# Altium footprint library gpa_connectors.PcbLib: 22 footprints (part 2 of 2)
Each footprint in its own frame and in the unit in brackets; x right, y up, seen from the top. Pads: shape width x height; smd on the part's side, far side on the other; paste and mask are expansions set on the pad; w line width, h text height; cw(c..) or ccw(c..) is an arc to the next point about the centre after c.
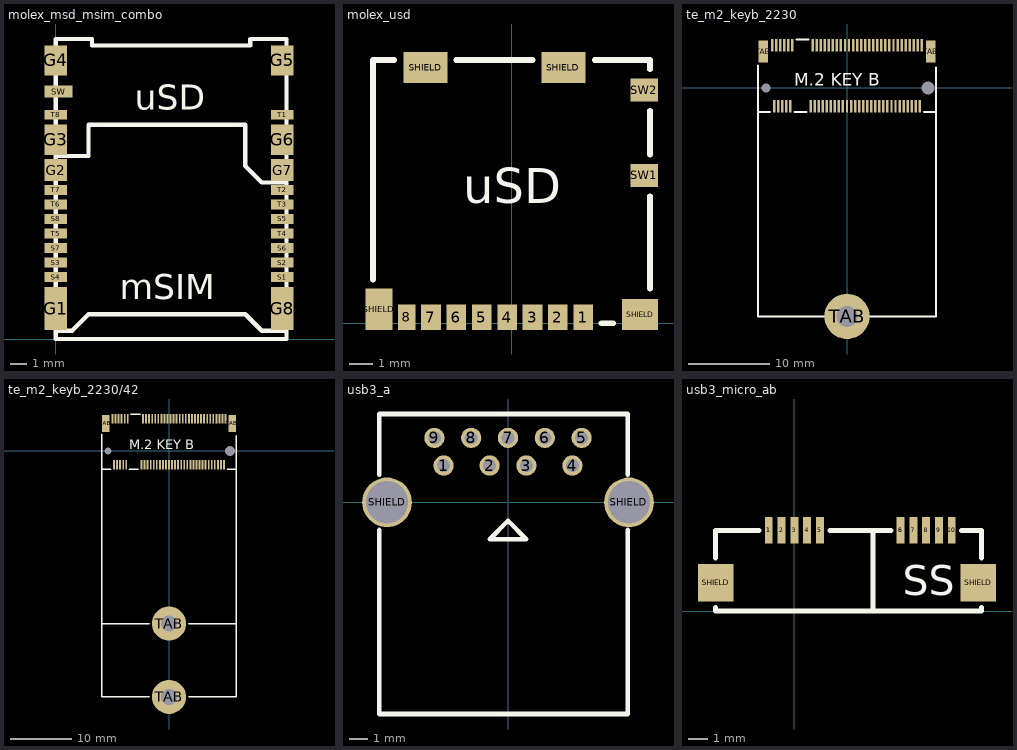
[diagram p1: the footprints below, top view; thin cyan lines are the x and y axes]

## molex_msd_msim_combo [mm]
pads (25):
  rect 1.35x2.6 smd: G1(0,1.85) G8(13.75,1.85)
  rect 1.35x1.34 smd: G2(0,10.25) G7(13.75,10.25)
  rect 1.35x1.84 smd: G3(0,12.09) G6(13.75,12.09)
  rect 1.35x1.8 smd: G4(0,16.9) G5(13.75,16.9)
  rect 1.35x0.58 smd: S1(13.75,3.76) S2(13.75,4.64) S3(0,4.64) S4(0,3.76) S5(13.75,7.28) S6(13.75,5.52) S7(0,5.52) S8(0,7.28) T1(13.75,13.6) T2(13.75,9.04) T3(13.75,8.16) T4(13.75,6.4) T5(0,6.4) T6(0,8.16) T7(0,9.04) T8(0,13.6)
  rect 1.7x0.7 smd: SW(0.175,15.015)
Top Overlay:
  lines w0.254: 0,0.5 1,0.5 2,1.5 11.5,1.5 12.5,0.5 14,0.5 ; 0,11.1 2,11.1 2,13 11.5,13 11.5,10.5 12.5,9.5 14,9.5 ; 0,0 0,18.2 2.2,18.2 2.2,17.8 11.8,17.8 11.8,18.2 14,18.2 14,0 0,0
  text "uSD" at 4.8,13.9 h1.52
  text "mSIM" at 3.9,2.4 h1.52
3D body "1046421610.stp": height 2.09, standoff -0.01, extent 0,0 14.1,18.25

## molex_usd [mm] "104031-0811"
pads (14):
  rect 0.85x1.1 smd: 1(3.105,0.25) 2(2.005,0.25) 3(0.905,0.25) 4(-0.195,0.25) 5(-1.295,0.25) 6(-2.395,0.25) 7(-3.495,0.25)
  rect 0.75x1.1 smd: 8(-4.545,0.25)
  rect 1.17x1.8 smd: SHIELD(-5.755,0.6)
  rect 1.9x1.35 smd: SHIELD(-3.73,11.075) SHIELD(2.24,11.075)
  rect 1.55x1.35 smd: SHIELD(5.565,0.375)
  rect 1.2x1 smd: SW1(5.74,6.4) SW2(5.74,10.1)
Top Overlay:
  lines w0.254: -6,1.9 -6,11.4 -5.1,11.4 ; -2.4,11.4 0.9,11.4 ; 3.6,11.4 6,11.4 6,11 ; 3.9,0 4.4,0 ; 6,1.5 6,5.5 ; 6,7.3 6,9.2
  text "uSD" at -2.1,5.2 h1.52
3D body "1040310811.stp": height 1.44, standoff -0.01, extent -5.975,0 5.975,11.4

## te_m2_keyb_2230 [mm] "TE Connectivity 2199230-5 + JAE SM3ZS067U410"
pads (72):
  rect 0.3x1.55 smd: 1(-9.25,5.275) 2(-9,-2.275) 3(-8.75,5.275) 4(-8.5,-2.275) 5(-8.25,5.275) 6(-8,-2.275) 7(-7.75,5.275) 8(-7.5,-2.275) 9(-7.25,5.275) 10(-7,-2.275) 11(-6.75,5.275) 20(-4.5,-2.275) 21(-4.25,5.275) 22(-4,-2.275) 23(-3.75,5.275) 24(-3.5,-2.275) 25(-3.25,5.275) 26(-3,-2.275) 27(-2.75,5.275) 28(-2.5,-2.275) 29(-2.25,5.275) 30(-2,-2.275) 31(-1.75,5.275) 32(-1.5,-2.275) 33(-1.25,5.275) 34(-1,-2.275) 35(-0.75,5.275) 36(-0.5,-2.275) 37(-0.25,5.275) 38(0,-2.275) 39(0.25,5.275) 40(0.5,-2.275) 41(0.75,5.275) 42(1,-2.275) 43(1.25,5.275) 44(1.5,-2.275) 45(1.75,5.275) 46(2,-2.275) 47(2.25,5.275) 48(2.5,-2.275) 49(2.75,5.275) 50(3,-2.275) 51(3.25,5.275) 52(3.5,-2.275) 53(3.75,5.275) 54(4,-2.275) 55(4.25,5.275) 56(4.5,-2.275) 57(4.75,5.275) 58(5,-2.275) 59(5.25,5.275) 60(5.5,-2.275) 61(5.75,5.275) 62(6,-2.275) 63(6.25,5.275) 64(6.5,-2.275) 65(6.75,5.275) 66(7,-2.275) 67(7.25,5.275) 68(7.5,-2.275) 69(7.75,5.275) 70(8,-2.275) 71(8.25,5.275) 72(8.5,-2.275) 73(8.75,5.275) 74(9,-2.275) 75(9.25,5.275)
  round 0.5 hole 1.1: ALIGN(-10,0)
  round 0.5 hole 1.6: ALIGN(10,0)
  rect 1.2x2.75 smd: TAB(-10.35,4.5) TAB(10.35,4.5)
  round 5.6 hole 2.6: TAB(0,-28.25)
Top Overlay:
  lines w0.254: -11,2.75 -11,-3 ; -9.5,-3 -11,-3 ; -6.5,-3 -5,-3 ; -6.25,6 -4.75,6 ; 9.5,-3 11,-3 ; 11,2.5 11,-3 ; -11,-3 -11,-28.25 1.75,-28.25 11,-28.25 11,-3
  text "M.2 KEY B" at -6.5,0.25 h1.52
3D body "c-2199230-5-b1-3d.stp": height 4.09, standoff -0.62, extent -10.95,-2.85 10.95,5.85

## te_m2_keyb_2230/42 [mm] "TE Connectivity 2199230-5 + JAE SM3ZS067U410"
pads (73):
  rect 0.3x1.55 smd: 1(-9.25,5.275) 2(-9,-2.275) 3(-8.75,5.275) 4(-8.5,-2.275) 5(-8.25,5.275) 6(-8,-2.275) 7(-7.75,5.275) 8(-7.5,-2.275) 9(-7.25,5.275) 10(-7,-2.275) 11(-6.75,5.275) 20(-4.5,-2.275) 21(-4.25,5.275) 22(-4,-2.275) 23(-3.75,5.275) 24(-3.5,-2.275) 25(-3.25,5.275) 26(-3,-2.275) 27(-2.75,5.275) 28(-2.5,-2.275) 29(-2.25,5.275) 30(-2,-2.275) 31(-1.75,5.275) 32(-1.5,-2.275) 33(-1.25,5.275) 34(-1,-2.275) 35(-0.75,5.275) 36(-0.5,-2.275) 37(-0.25,5.275) 38(0,-2.275) 39(0.25,5.275) 40(0.5,-2.275) 41(0.75,5.275) 42(1,-2.275) 43(1.25,5.275) 44(1.5,-2.275) 45(1.75,5.275) 46(2,-2.275) 47(2.25,5.275) 48(2.5,-2.275) 49(2.75,5.275) 50(3,-2.275) 51(3.25,5.275) 52(3.5,-2.275) 53(3.75,5.275) 54(4,-2.275) 55(4.25,5.275) 56(4.5,-2.275) 57(4.75,5.275) 58(5,-2.275) 59(5.25,5.275) 60(5.5,-2.275) 61(5.75,5.275) 62(6,-2.275) 63(6.25,5.275) 64(6.5,-2.275) 65(6.75,5.275) 66(7,-2.275) 67(7.25,5.275) 68(7.5,-2.275) 69(7.75,5.275) 70(8,-2.275) 71(8.25,5.275) 72(8.5,-2.275) 73(8.75,5.275) 74(9,-2.275) 75(9.25,5.275)
  round 0.5 hole 1.1: ALIGN(-10,0)
  round 0.5 hole 1.6: ALIGN(10,0)
  rect 1.2x2.75 smd: TAB(-10.35,4.5) TAB(10.35,4.5)
  round 5.6 hole 2.6: TAB(0,-40.25) TAB(0,-28.25)
Top Overlay:
  lines w0.254: -11,-28.25 -3.25,-28.25 ; -11,2.75 -11,-3 ; -9.5,-3 -11,-3 ; -6.5,-3 -5,-3 ; -6.25,6 -4.75,6 ; -3.25,-40.25 -11,-40.25 -11,-3 ; 3.25,-40.25 11,-40.25 11,-3 ; 3.25,-28.25 11,-28.25 ; 9.5,-3 11,-3 ; 11,2.5 11,-3
  text "M.2 KEY B" at -6.5,0.25 h1.52
3D body "c-2199230-5-b1-3d.stp": height 4.09, standoff -0.62, extent -10.95,-2.85 10.95,5.85

## usb3_a [mm] "Molex 48405-000X"
pads (11):
  round 1.1 hole 0.7: 1(-3.5,2) 2(-1,2) 3(1,2) 4(3.5,2) 5(4,3.5) 6(2,3.5) 7(0,3.5) 8(-2,3.5) 9(-4,3.5)
  round 2.7 hole 2.3: SHIELD(-6.57,0) SHIELD(6.57,0)
Top Overlay:
  lines w0.254: -7,-1.5 -7,-11.5 6.5,-11.5 6.5,-1.5 ; -7,1.5 -7,4.8 6.5,4.8 6.5,1.5 ; -1,-2 1,-2 0,-1 -1,-2
3D body "484050003.stp": height 7.56, standoff -4.04, extent -7.73,-11.75 7.73,4.75

## usb3_micro_ab [mm]
pads (14):
  rect 0.4x1.35 smd: 1(-1.3,4.125) 1(-1.3,4.125) 2(-0.65,4.125) 3(0,4.125) 4(0.65,4.125) 5(1.3,4.125) 6(5.4,4.125) 6(5.4,4.125) 7(6.05,4.125) 8(6.7,4.125) 9(7.35,4.125) 10(8,4.125)
  rect 1.8x1.9 smd: SHIELD(-4,1.45) SHIELD(9.35,1.45)
Top Overlay:
  lines w0.254: -4,0.2 -4,0 9.5,0 9.5,0.2 ; -4,2.7 -4,4.1 -1.8,4.1 ; 1.8,4.1 4.9,4.1 ; 4,0 4,4.1 ; 8.5,4.1 9.5,4.1 9.5,2.7
  text "SS" at 5.5,0.8 h1.52
3D body "UJ3-MIABH-1-SMT.stp": height 2.7, standoff -0.32, extent -4.4,-1.334 9.75,4.375